# Altium footprint library ESKDPcbLib.PcbLib: 608 footprints (part 34 of 38)
Each footprint in its own frame and in the unit in brackets; x right, y up, seen from the top. Pads: shape width x height; smd on the part's side, far side on the other; paste and mask are expansions set on the pad; w line width, h text height; cw(c..) or ccw(c..) is an arc to the next point about the centre after c.
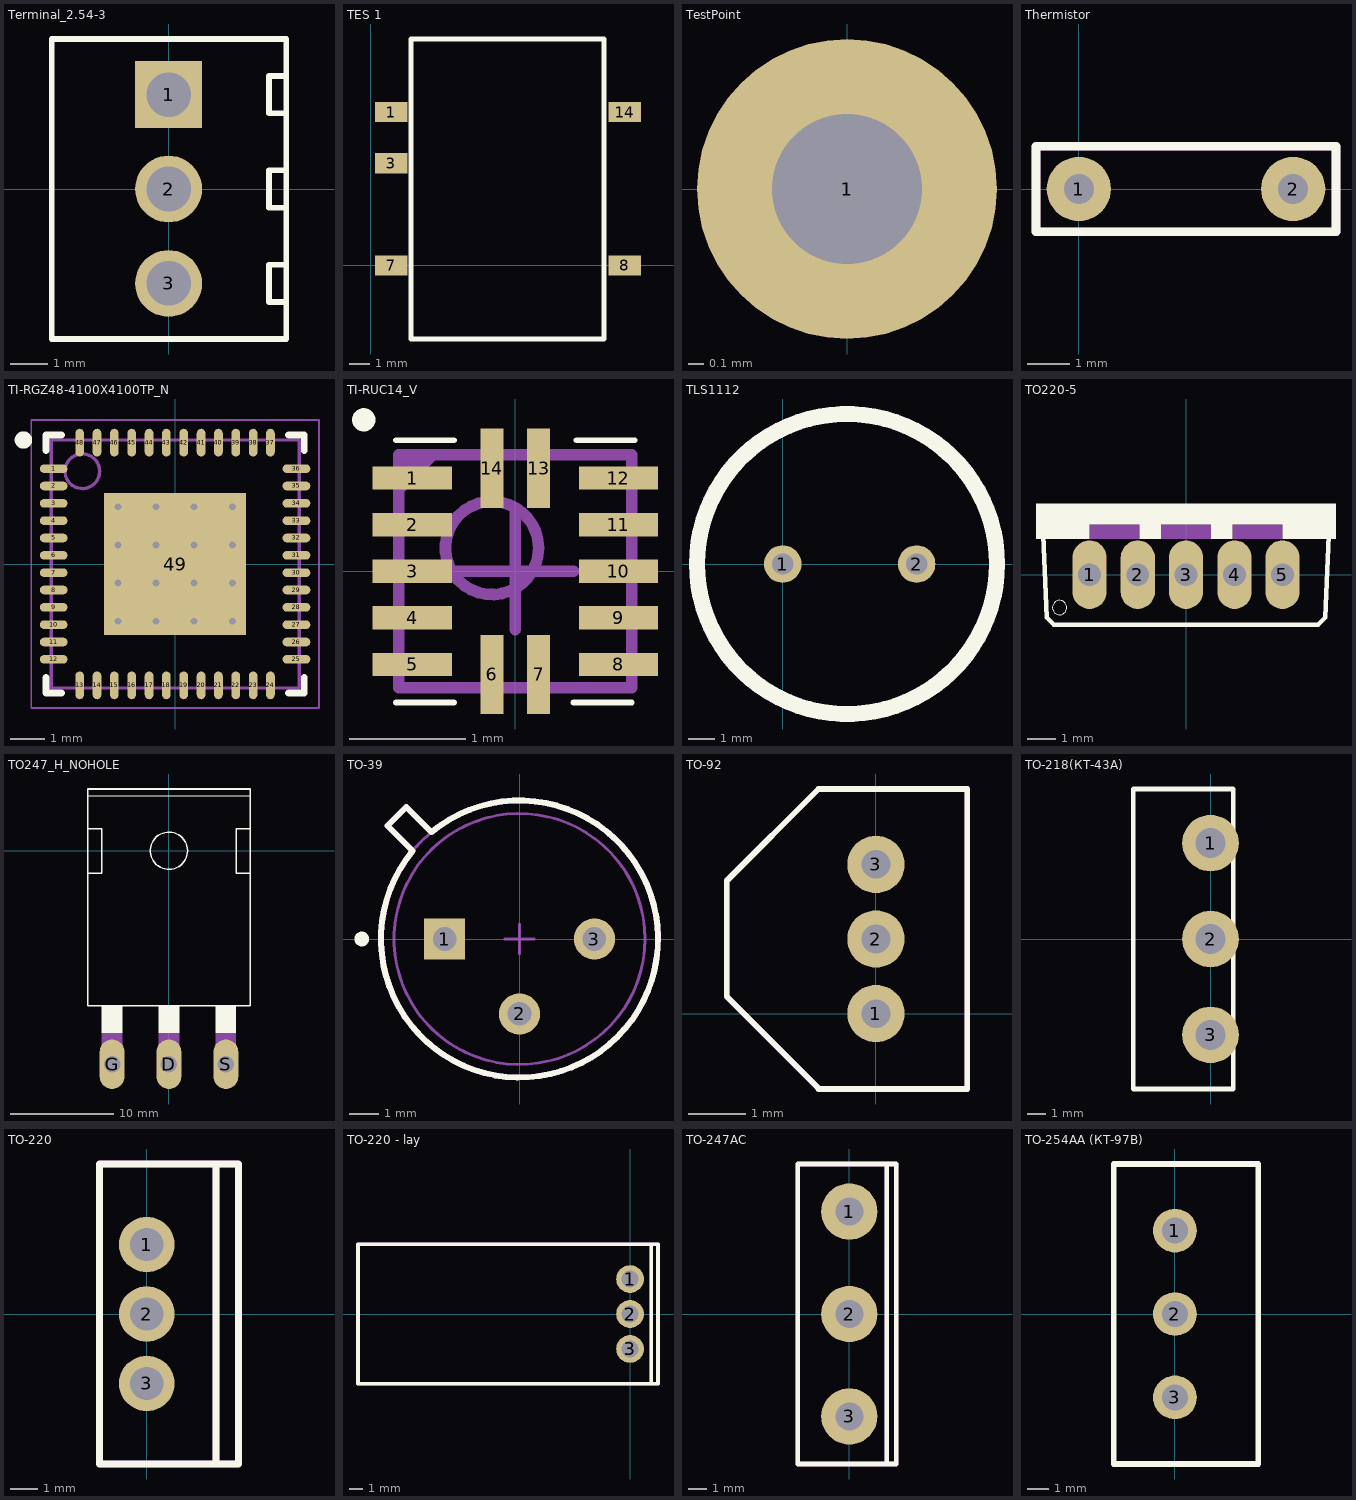
[diagram p33: the footprints below, top view; thin cyan lines are the x and y axes]

## Terminal_2.54-3 [mm]
height 8.5
pads (3):
  rect 1.8x1.8 hole 1.2: 1(0,2.54)
  round 1.8 hole 1.2: 2(0,0) 3(0,-2.54)
Top Overlay:
  lines w0.15: 3.16,-3.04 2.7,-3.04 2.7,-2.04 3.16,-2.04 ; 3.16,-0.5 2.7,-0.5 2.7,0.5 3.16,0.5 ; 3.16,2.04 2.7,2.04 2.7,3.04 3.16,3.04 ; -3.14,-4.035 3.16,-4.035 3.16,4.035 -3.14,4.035 -3.14,-4.035
Mechanical 7:
  lines w0.1: 3.16,-3.04 2.7,-3.04 2.7,-2.04 3.16,-2.04 ; 3.16,-0.5 2.7,-0.5 2.7,0.5 3.16,0.5 ; 3.16,2.04 2.7,2.04 2.7,3.04 3.16,3.04 ; -3.14,-4.035 -3.14,4.035 3.16,4.035 3.16,-4.035 -3.14,-4.035
Mechanical 10:
  text ".Designator" at -1.175,5.245 h0.8
  text ".Comment" at -1.15,4.545 h0.6
3D body: height 8.5, standoff 0, extent -3.14,-4.035 3.16,4.035

## TES 1 [mm] "Посадка для DC/DC TES 1"
pads (5):
  rect 1.6x1 smd: 1(1.016,7.62) 3(1.016,5.08) 7(1.016,0) 8(12.624,0) 14(12.624,7.62)
Top Overlay:
  lines w0.254: 2.007,-3.658 2.007,11.252 11.582,11.252 11.582,-3.658 2.007,-3.658

## TestPoint [mm]
pads (1):
  round 2 hole 1: 1(0,0)

## Thermistor [mm]
pads (2):
  round 1.5 hole 0.7: 1(0,0) 2(5,0)
Top Overlay:
  lines w0.2: -1,-1 -1,1 6,1 6,-1 -1,-1
Mechanical 7:
  lines w0.2: -1,-1 6,-1 6,1 -1,1 -1,-1
Mechanical 10:
  text ".Comment" at 3.58,-1.79 h0.6
  text ".Designator" at 2.57,1.53 h0.8

## TI-RGZ48-4100X4100TP_N [mm] "QFN, 48-Leads, Body 7x7mm, Pitch 0.5mm, Thermal Pad 4.1x4.1mm, IPC Medium Density"
height 1
pads (49):
  oval 0.8x0.25 smd: 1(-3.5,2.75) 2(-3.5,2.25) 3(-3.5,1.75) 4(-3.5,1.25) 5(-3.5,0.75) 6(-3.5,0.25) 7(-3.5,-0.25) 8(-3.5,-0.75) 9(-3.5,-1.25) 10(-3.5,-1.75) 11(-3.5,-2.25) 12(-3.5,-2.75) 25(3.5,-2.75) 26(3.5,-2.25) 27(3.5,-1.75) 28(3.5,-1.25) 29(3.5,-0.75) 30(3.5,-0.25) 31(3.5,0.25) 32(3.5,0.75) 33(3.5,1.25) 34(3.5,1.75) 35(3.5,2.25) 36(3.5,2.75)
  oval 0.25x0.8 smd: 13(-2.75,-3.5) 14(-2.25,-3.5) 15(-1.75,-3.5) 16(-1.25,-3.5) 17(-0.75,-3.5) 18(-0.25,-3.5) 19(0.25,-3.5) 20(0.75,-3.5) 21(1.25,-3.5) 22(1.75,-3.5) 23(2.25,-3.5) 24(2.75,-3.5) 37(2.75,3.5) 38(2.25,3.5) 39(1.75,3.5) 40(1.25,3.5) 41(0.75,3.5) 42(0.25,3.5) 43(-0.25,3.5) 44(-0.75,3.5) 45(-1.25,3.5) 46(-1.75,3.5) 47(-2.25,3.5) 48(-2.75,3.5)
  rect 4.1x4.1 smd: 49(0,0)
via 1.65,-1.65 diameter 0.5 hole 0.2
via 0.55,-1.65 diameter 0.5 hole 0.2
via -0.55,-1.65 diameter 0.5 hole 0.2
via -1.65,-1.65 diameter 0.5 hole 0.2
via 1.65,-0.55 diameter 0.5 hole 0.2
via 0.55,-0.55 diameter 0.5 hole 0.2
via -0.55,-0.55 diameter 0.5 hole 0.2
via -1.65,-0.55 diameter 0.5 hole 0.2
via 1.65,0.55 diameter 0.5 hole 0.2
via 0.55,0.55 diameter 0.5 hole 0.2
via -0.55,0.55 diameter 0.5 hole 0.2
via -1.65,0.55 diameter 0.5 hole 0.2
via 1.65,1.65 diameter 0.5 hole 0.2
via 0.55,1.65 diameter 0.5 hole 0.2
via -0.55,1.65 diameter 0.5 hole 0.2
via -1.65,1.65 diameter 0.5 hole 0.2
Top Overlay:
  circle w0.25: c-4.375,3.575 r0.125
  lines w0.2: -3.725,-3.275 -3.725,-3.725 -3.275,-3.725 ; -3.725,3.275 -3.725,3.725 -3.275,3.725 ; 3.275,-3.725 3.725,-3.725 3.725,-3.275 ; 3.275,3.725 3.725,3.725 3.725,3.275
Mechanical 13:
  circle w0.1: c-2.675,2.675 r0.5
  lines w0.1: -3.575,-3.575 3.575,-3.575 3.575,3.575 -3.575,3.575 -3.575,-3.575
Mechanical 15:
  lines w0.05: -4.15,-4.15 4.15,-4.15 4.15,4.15 -4.15,4.15 -4.15,-4.15
  lines w0.1: -0.5,0 0.5,0 ; 0,-0.5 0,0.5
3D body: height 1, standoff 0, extent -3.575,-3.575 3.575,3.575

## TI-RUC14_V [mm] "QFN, 14-Leads, Body 2x2mm, Pitch 0.4mm"
height 0.4
pads (14):
  rect 0.68x0.2 smd mask+0.075: 1(-0.885,0.8) 2(-0.885,0.4) 3(-0.885,0) 4(-0.885,-0.4) 5(-0.885,-0.8) 8(0.885,-0.8) 9(0.885,-0.4) 10(0.885,0) 11(0.885,0.4) 12(0.885,0.8)
  rect 0.2x0.68 smd mask+0.075: 6(-0.2,-0.885) 7(0.2,-0.885) 13(0.2,0.885) 14(-0.2,0.885)
Top Overlay:
  circle w0.1: c-1.3,1.3 r0.05
  lines w0.05: -1.025,-1.125 -0.525,-1.125 ; -1.025,1.125 -0.525,1.125 ; 0.5,-1.125 1,-1.125 ; 0.525,1.125 1.025,1.125
Mechanical 7:
  lines w0.05: -0.985,0.684 -0.68,0.989 ; -1,-1 -1,1 1,1 1,-1 -1,-1
  lines w0.1: -0.956,0.764 -0.76,0.96 ; -0.956,0.819 -0.803,0.972 ; -0.956,0.919 -0.915,0.96 ; -0.5,0 0.5,0 ; 0,-0.5 0,0.5
Mechanical 9:
  circle w0.1: c-0.2,0.2 r0.4
  lines w0.1: -1,-1 1,-1 1,1 -1,1 -1,-1
Mechanical 10:
  text ".Comment" at -0.76,1.625 h0.6
  text ".Designator" at -0.875,-1.725 h0.6
3D body: height 0.4, standoff 0, extent -1,-1 1,1

## TLS1112 [mm]
pads (2):
  round 1.4 hole 0.8: 1(0,0) 2(5,0)
Top Overlay:
  circle w0.6: c2.4,0 r5.6
3D body: height 12.2, standoff 0, extent -3.056,-5.589 8.1,5.589

## TO220-5 [mil]
pads (5):
  oval 48x96 hole 32: 1(-135,0) 2(-67.5,0) 3(0,0) 4(68,0) 5(135,0)
Top Overlay:
  circle w0: c-177,-46 r10
  rectangle: 135,50 210,70
  rectangle: 35,50 65,70
  rectangle: -65,50 -35,70
  rectangle: -210,50 -135,70
  rectangle: -210,70 210,100
  lines w6: -200,55 -195,-60 -185,-70 185,-70 195,-60 200,55
Mechanical 16:
  rectangle: 65,50 135,70
  rectangle: -35,50 35,70
  rectangle: -135,50 -65,70

## TO247_H_NOHOLE [mil]
pads (3):
  oval 94.5x189 hole 63: D(0,-812.99) G(-216.54,-812.99) S(217,-812.99)
Top Overlay:
  circle w5: c0,0 r71
  rectangle: 178,-694.88 256,-590.55
  rectangle: -39.37,-694.88 40,-590.55
  rectangle: -255.91,-694.88 -177.17,-590.55
  lines w2: -307.87,210 308,210
  lines w6: -310,-86.18 -310,-590.55 310,-590.55 310,-86.18 ; -310,-86.18 -310,84 ; -310,-86.18 -255.91,-86.18 -255.91,84 -310,84 ; -310,84 -310,235 310,235 310,84 ; 310,-86.18 256,-86.18 256,84 310,84 ; 310,-86.18 310,84
Mechanical 16:
  rectangle: -255.91,-774.92 -177.17,-694.88
  rectangle: -245,-812.99 -187.01,-774.92
  rectangle: -39.37,-774.92 40,-694.92
  rectangle: -25,-812.99 25,-774.92
  rectangle: 178,-774.92 256,-694.92
  rectangle: 188,-812.99 245,-774.92

## TO-39 [mm] "Can; 3 Leads; Pin Circle Dia. 5.08 mm; Lead Dia. 0.48 mm (max)"
height 4.7
pads (3):
  rect 1.4x1.4 hole 0.8: 1(-2.54,0)
  round 1.4 hole 0.8: 2(0,-2.54) 3(2.54,0)
Top Overlay:
  circle w0.25: c-5.35,0 r0.125
  lines w0.2: -3.626,2.99 -4.475,3.838 -3.838,4.475 -2.99,3.626 ; -3.622,2.987 ccw(c0,0) -2.987,3.622
Mechanical 7:
  lines w0.1: -0.5,0 0.5,0 ; 0,-0.5 0,0.5
  lines w0.2: -3.626,2.99 -4.475,3.838 -3.838,4.475 -2.99,3.626 ; -3.622,2.987 ccw(c0,0) -2.987,3.622
Mechanical 9:
  circle w0.1: c0,0 r4.695
  circle w0.1: c0,0 r4.255
Mechanical 10:
  text ".Comment" at -1.275,5.1 h0.7
  text ".Designator" at -0.975,-5.475 h0.7
3D body: height 1.27, standoff 0, extent -4.694,-4.694 4.694,4.694
3D body: height 4.7, standoff 1.27, extent -4.254,-4.254 4.254,4.254

## TO-92 [mm]
pads (3):
  round 1 hole 0.5: 1(0,0) 2(0,1.3) 3(0,2.6)
Top Overlay:
  lines w0.1: -2.6,0.3 -1,-1.3 -1,-1.313 1.591,-1.313 1.591,3.913 -1,3.913 -2.6,2.313 -2.6,0.3
Mechanical 7:
  lines w0.1: -2.6,0.3 -0.987,-1.313 1.591,-1.313 1.591,3.913 -1,3.913 -2.6,2.313 -2.6,0.3
3D body: height 10, standoff -3, extent -2.613,-1.313 1.591,3.913

## TO-218(КТ-43А) [mm]
pads (3):
  round 3 hole 1.6: 1(0,5.08) 2(0,0) 3(0,-5.08)
Top Overlay:
  lines w0.254: -4.1,-7.95 1.2,-7.95 1.2,7.95 -4.1,7.95 -4.1,-7.95
Mechanical 10:
  text ".Comment" at 2.525,4.925 h1
  text ".Designator" at 2.525,5.925 h1

## TO-220 [mm]
pads (3):
  round 2 hole 1.2: 1(0,2.5) 2(0,0) 3(0,-2.5)
Top Overlay:
  lines w0.254: 2.5,-5.4 2.5,5.4 ; -1.7,-5.4 3.3,-5.4 3.3,5.4 -1.7,5.4 -1.7,-5.4
Mechanical 7:
  lines w0.254: 2.5,-5.4 2.5,5.4 ; -1.7,-5.4 3.3,-5.4 3.3,5.4 -1.7,5.4 -1.7,-5.4
Mechanical 10:
  text ".Designator" at 0,6 h1.52
  text ".Comment" at 0,7 h1.52
3D body "to-220.stp": height 22.66, standoff -8.33, extent -1.58,-5.335 3.25,5.335

## TO-220 - lay [mm]
pads (3):
  round 2 hole 1.2: 1(0,2.5) 2(0,0) 3(0,-2.5)
Top Overlay:
  lines w0.254: 1.5,-5 1.5,5 ; -19.5,-5 2,-5 2,5 -19.5,5 -19.5,-5
Mechanical 7:
  lines w0.254: 1.5,-5 1.5,5 ; -19.5,-5 2,-5 2,5 -19.5,5 -19.5,-5
Mechanical 10:
  text ".Designator" at -18.5,6 h1.52
  text ".Comment" at -18.5,7 h1.52
3D body "to-220-ab-lay.STEP": height 5, standoff -3.71, extent -19.28,-4.95 0.4,4.95

## TO-247AC [mm]
pads (3):
  round 3 hole 1.5: 1(0,5.46) 2(0,0) 3(0,-5.46)
Top Overlay:
  lines w0.254: 2,-8 2,8 ; -2.75,-8 2.5,-8 2.5,8 -2.75,8 -2.75,-8
Mechanical 7:
  lines w0.254: 2,-8 2,8 ; -2.75,-8 -2.75,8 2.5,8 2.5,-8 -2.75,-8
Mechanical 10:
  text ".Designator" at 4.1,5.35 h1.5
  text ".Comment" at 4.1,4.08 h1.5
3D body "TO_247AC.step": height 24, standoff -12.05, extent -2.77,-7.9 2.54,7.9

## TO-254AA (КТ-97В) [mm]
pads (3):
  round 2 hole 1.2: 1(0,3.81) 2(0,0) 3(0,-3.81)
Top Overlay:
  lines w0.254: -2.7,-6.85 -2.8,-6.85 ; -2.8,-6.85 -2.8,6.85 3.81,6.85 3.81,-6.85 -2.79,-6.85 -2.8,-6.85
Mechanical 10:
  text ".Designator" at 4.3,2.7 h1
  text ".Comment" at 4.3,1.7 h1
3D body "TO-254AA.STEP": height 20.32, standoff -11, extent -2.825,-6.9 3.775,6.9